# Altium footprint library MyComponents_v2.5.PcbLib: 403 footprints (part 21 of 26)
Each footprint in its own frame and in the unit in brackets; x right, y up, seen from the top. Pads: shape width x height; smd on the part's side, far side on the other; paste and mask are expansions set on the pad; w line width, h text height; cw(c..) or ccw(c..) is an arc to the next point about the centre after c.
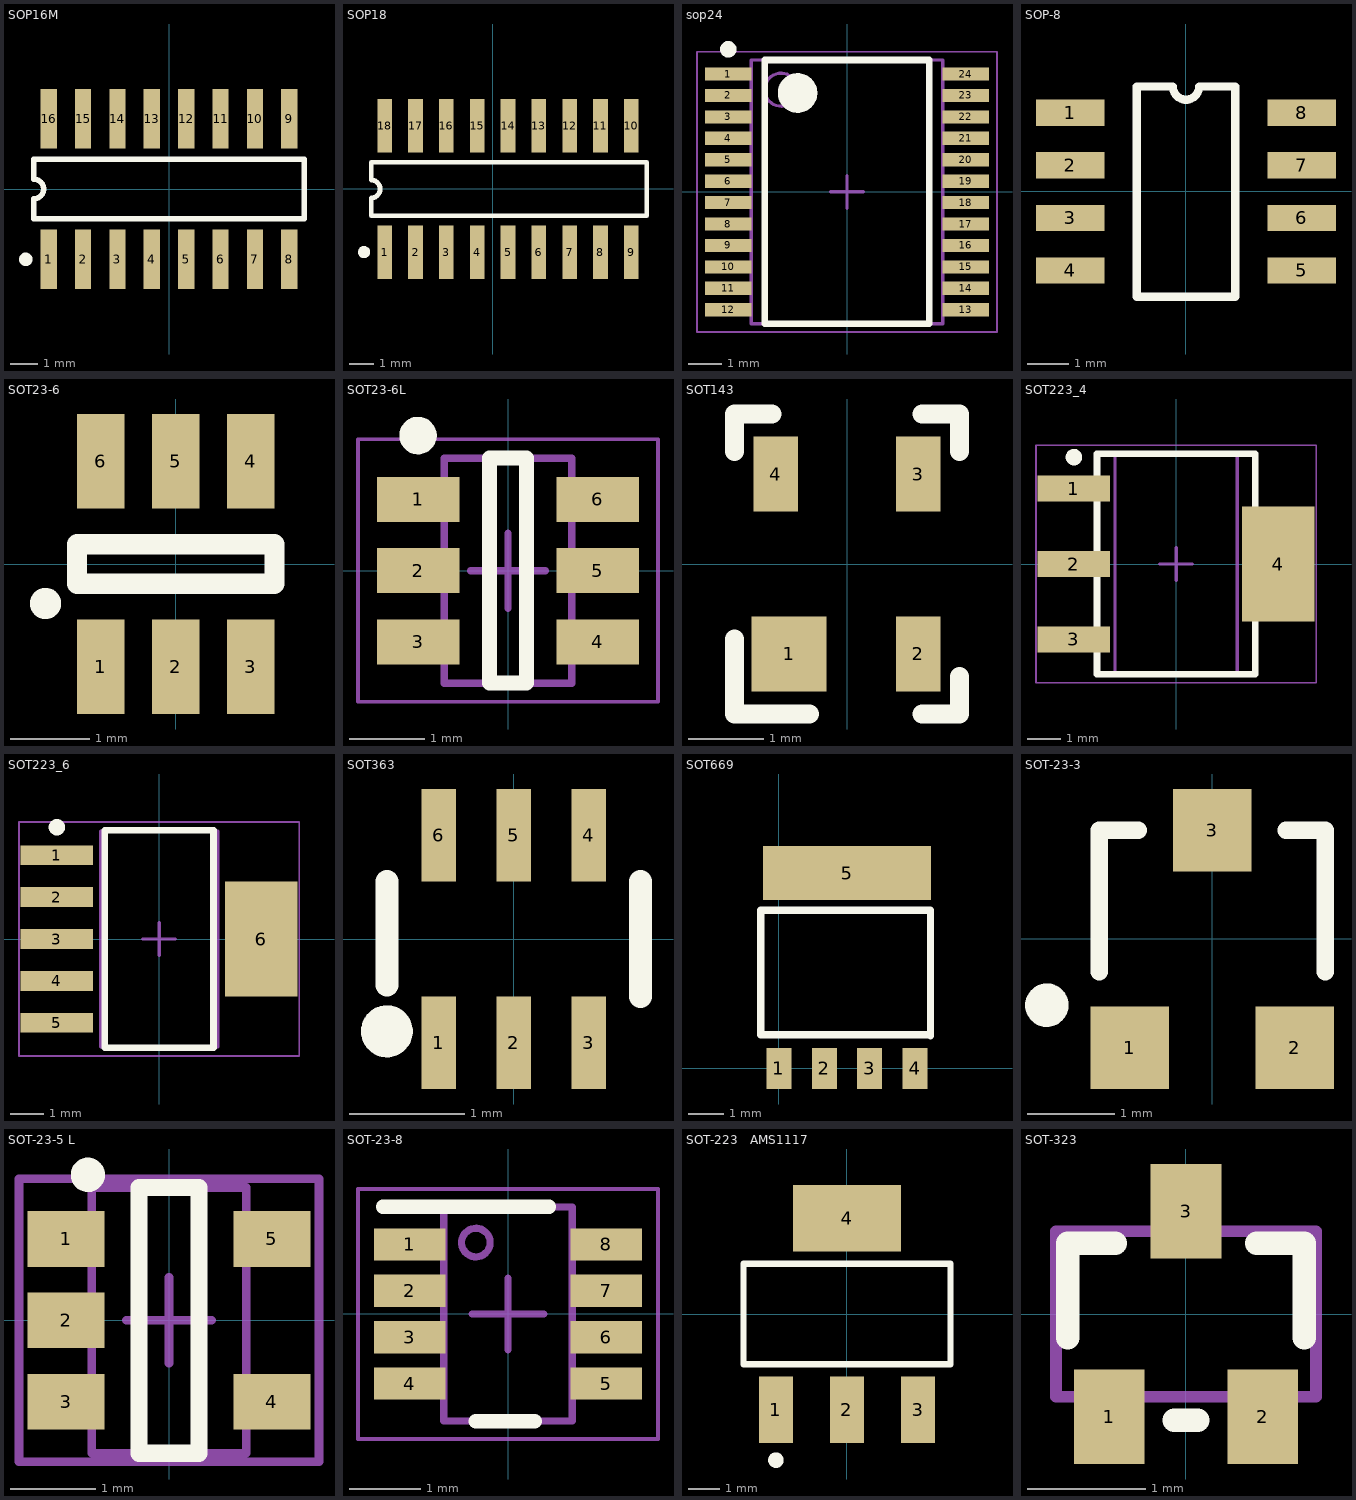
[diagram p20: the footprints below, top view; thin cyan lines are the x and y axes]

## SOP16M [mm]
pads (16):
  rect 0.6x2.2 smd: 1(-4.445,-2.6) 2(-3.175,-2.6) 3(-1.905,-2.6) 4(-0.635,-2.6) 5(0.635,-2.6) 6(1.905,-2.6) 7(3.175,-2.6) 8(4.445,-2.6) 9(4.445,2.6) 10(3.175,2.6) 11(1.905,2.6) 12(0.635,2.6) 13(-0.635,2.6) 14(-1.905,2.6) 15(-3.175,2.6) 16(-4.445,2.6)
Top Overlay:
  circle w0.25: c-5.295,-2.6 r0.125
  lines w0.2: -5,-1.1 -5,-0.367 ccw(c-5,0) -5,0.367 -5,1.1 5,1.1 5,-1.1 -5,-1.1

## SOP18 [mm]
pads (18):
  rect 0.6x2.2 smd: 1(-4.445,-2.6) 2(-3.175,-2.6) 3(-1.905,-2.6) 4(-0.635,-2.6) 5(0.635,-2.6) 6(1.905,-2.6) 7(3.175,-2.6) 8(4.445,-2.6) 9(5.715,-2.6) 10(5.715,2.6) 11(4.445,2.6) 12(3.175,2.6) 13(1.905,2.6) 14(0.635,2.6) 15(-0.635,2.6) 16(-1.905,2.6) 17(-3.175,2.6) 18(-4.445,2.6)
Top Overlay:
  circle w0.25: c-5.295,-2.6 r0.125
  lines w0.2: -5,-1.1 -5,-0.367 ccw(c-5,0) -5,0.367 -5,1.1 6.35,1.1 6.35,-1.1 -5,-1.1

## sop24 [mm] "TSOP, 24-Leads, Body 7.80x5.60mm, Pitch 0.65mm, IPC Medium Density"
height 1.6
pads (24):
  rect 1.4x0.4 smd: 1(-3.6,3.575) 2(-3.6,2.925) 3(-3.6,2.275) 4(-3.6,1.625) 5(-3.6,0.975) 6(-3.6,0.325) 7(-3.6,-0.325) 8(-3.6,-0.975) 9(-3.6,-1.625) 10(-3.6,-2.275) 11(-3.6,-2.925) 12(-3.6,-3.575) 13(3.6,-3.575) 14(3.6,-2.925) 15(3.6,-2.275) 16(3.6,-1.625) 17(3.6,-0.975) 18(3.6,-0.325) 19(3.6,0.325) 20(3.6,0.975) 21(3.6,1.625) 22(3.6,2.275) 23(3.6,2.925) 24(3.6,3.575)
Top Overlay:
  circle w0.6: c-1.5,3 r0.3
  circle w0.25: c-3.6,4.325 r0.125
  lines w0.2: -2.5,-4 2.5,-4 2.5,4 -2.5,4 -2.5,-4
Mechanical 13:
  circle w0.1: c-2,3.1 r0.5
  lines w0.1: -2.9,-4 2.9,-4 2.9,4 -2.9,4 -2.9,-4
Mechanical 15:
  lines w0.05: -4.55,-4.25 4.55,-4.25 4.55,4.25 -4.55,4.25 -4.55,-4.25
  lines w0.1: -0.5,0 0.5,0 ; 0,-0.5 0,0.5
3D body: height 1.6, standoff 0.1, extent -2.9,-4 2.9,4

## SOP-8 [mm]
pads (8):
  rect 1.651x0.635 smd: 1(-2.8,1.9) 2(-2.8,0.63) 3(-2.8,-0.64) 4(-2.8,-1.91) 5(2.8,-1.91) 6(2.8,-0.64) 7(2.8,0.63) 8(2.8,1.9)
Top Overlay:
  lines w0.2: -1.19,-2.545 1.19,-2.545 1.19,2.535 0.317,2.535 cw(c0,2.535) -0.318,2.535 -1.19,2.535 -1.19,-2.545
3D body "SOP8.STEP": height 1.6, standoff 0, extent -3.021,-2.51 3.021,2.51

## SOT23-6 [mm]
pads (6):
  rect 0.6x1.2 smd: 1(-0.95,-1.3) 2(0,-1.3) 3(0.95,-1.3) 4(0.95,1.3) 5(0,1.3) 6(-0.95,1.3)
Top Overlay:
  circle w0.254: c-1.65,-0.5 r0.071
  lines w0.254: -1.25,-0.25 1.25,-0.25 1.25,0.25 -1.25,0.25 -1.25,-0.25
3D body "SOT23-6-2.step": height 1.45, standoff 0, extent -1.478,-1.451 1.422,1.349

## SOT23-6L [mm] "SOT23, 6-Leads, Body 2.90x2.80mm, Pitch 0.95mm, IPC Medium Density"
height 1.45
pads (6):
  rect 1.1x0.6 smd: 1(-1.2,0.95) 2(-1.2,0) 3(-1.2,-0.95) 4(1.2,-0.95) 5(1.2,0) 6(1.2,0.95)
Top Overlay:
  circle w0.25: c-1.2,1.8 r0.125
  lines w0.2: -0.25,-1.5 -0.25,1.5 0.25,1.5 0.25,-1.5 -0.25,-1.5
Mechanical 13:
  lines w0.1: -0.85,-1.5 0.85,-1.5 0.85,1.5 -0.85,1.5 -0.85,-1.5
Mechanical 15:
  lines w0.05: -2,-1.75 2,-1.75 2,1.75 -2,1.75 -2,-1.75
  lines w0.1: -0.5,0 0.5,0 ; 0,-0.5 0,0.5
3D body: height 0.25, standoff 0, extent -0.483,-1.219 -0.483,-1.219
3D body "SOT23-6-2.step": height 1.45, standoff 0, extent -1.374,-1.475 1.426,1.425

## SOT143 [mm]
pads (4):
  rect 1x1 smd: 1(-0.77,-1.2)
  rect 0.6x1 smd: 2(0.95,-1.2) 3(0.95,1.2) 4(-0.95,1.2)
Top Overlay:
  lines w0.254: -1.5,-1 -1.5,-2 -0.5,-2 ; -1.5,1.5 -1.5,2 -1,2 ; 1,-2 1.5,-2 1.5,-1.5 ; 1,2 1.5,2 1.5,1.5
3D body "User Library-sot143.STEP": height 1, standoff 0, extent -1.46,-1.21 1.46,1.21

## SOT223_4 [mm] "SOT223, 4-Leads, Body 6.50x7.00mm (avg), Pitch 2.29mm, IPC Medium Density"
height 1.8
pads (4):
  rect 2.2x0.8 smd: 1(-3.1,2.29) 2(-3.1,0) 3(-3.1,-2.29)
  rect 2.2x3.5 smd: 4(3.1,0)
Top Overlay:
  circle w0.25: c-3.1,3.24 r0.125
  lines w0.2: -2.4,-3.35 -2.4,3.35 2.4,3.35 2.4,-3.35 -2.4,-3.35
Mechanical 13:
  lines w0.1: -1.855,-3.355 -1.855,3.355 1.855,3.355 1.855,-3.355 -1.855,-3.355
Mechanical 15:
  lines w0.05: -4.25,-3.6 -4.25,3.6 4.25,3.6 4.25,-3.6 -4.25,-3.6
  lines w0.1: -0.5,0 0.5,0 ; 0,-0.5 0,0.5
3D body: height 1.8, standoff 0.64, extent -1.855,-3.355 1.855,3.355

## SOT223_6 [mm] "SOT223, 6-Leads, Body 6.50x7.06mm (avg), Pitch 1.27mm, IPC Medium Density"
height 1.65
pads (6):
  rect 2.2x0.6 smd: 1(-3.1,2.54) 2(-3.1,1.27) 3(-3.1,0) 4(-3.1,-1.27) 5(-3.1,-2.54)
  rect 2.2x3.5 smd: 6(3.1,0)
Top Overlay:
  circle w0.25: c-3.1,3.39 r0.125
  lines w0.2: -1.65,-3.3 -1.65,3.3 1.65,3.3 1.65,-3.3 -1.65,-3.3
Mechanical 13:
  lines w0.1: -1.775,-3.275 -1.775,3.275 1.775,3.275 1.775,-3.275 -1.775,-3.275
Mechanical 15:
  lines w0.05: -4.25,-3.55 -4.25,3.55 4.25,3.55 4.25,-3.55 -4.25,-3.55
  lines w0.1: -0.5,0 0.5,0 ; 0,-0.5 0,0.5
3D body: height 1.65, standoff 0.02, extent -1.775,-3.275 1.775,3.275

## SOT363 [mm]
pads (6):
  rect 0.3x0.8 smd: 1(-0.65,-0.9) 2(0,-0.9) 3(0.65,-0.9) 4(0.65,0.9) 5(0,0.9) 6(-0.65,0.9)
Top Overlay:
  circle w0.25: c-1.1,-0.8 r0.1
  lines w0.2: -1.1,-0.4 -1.1,0.5 ; 1.1,-0.5 1.1,0.5
3D body "sot363.step": height 1, standoff 0, extent -1.05,-1.15 1.05,1.15

## SOT669 [mm]
pads (5):
  rect 0.7x1.15 smd: 1(0,0) 2(1.27,0) 3(2.54,0) 4(3.81,0)
  rect 4.7x1.5 smd: 5(1.905,5.461)
Top Overlay:
  lines w0.203: -0.508,0.94 -0.508,4.42 4.242,4.42 4.242,4.369 4.242,0.914 4.216,0.94 -0.508,0.94

## SOT-23-3 [mm]
pads (3):
  rect 0.9x0.95 smd: 1(-0.95,-1.25) 2(0.95,-1.25) 3(0,1.25)
Top Overlay:
  circle w0.25: c-1.903,-0.762 r0.125
  lines w0.2: -1.3,-0.375 -1.3,1.25 -0.85,1.25 ; 0.85,1.25 1.3,1.25 1.3,-0.375
3D body "sot23-3.STEP": height 1, standoff -0.02, extent -1.46,-1.194 1.46,1.282

## SOT-23-5 L [mm]
pads (5):
  rect 0.9x0.65 smd: 1(-1.2,0.95) 2(-1.2,0) 3(-1.2,-0.95) 4(1.2,-0.95) 5(1.2,0.95)
Top Overlay:
  circle w0.2: c-0.946,1.698 r0.1
  lines w0.2: -0.35,-1.55 -0.35,1.55 0.35,1.55 0.35,-1.55 -0.35,-1.55
Mechanical 13:
  lines w0.1: -0.9,-1.55 0.9,-1.55 0.9,1.55 -0.9,1.55 -0.9,-1.55
Mechanical 15:
  lines w0.1: -0.5,0 0.5,0 ; 0,-0.5 0,0.5 ; -1.75,-1.65 1.75,-1.65 1.75,1.65 -1.75,1.65 -1.75,-1.65
3D body "User Library-SOT23-5.STEP": height 1.09, standoff -0.01, extent -1.375,-1.46 1.425,1.44

## SOT-23-8 [mm]
pads (8):
  rect 1x0.45 smd paste+0 mask+0.051: 1(-1.375,0.975) 2(-1.375,0.325) 3(-1.375,-0.325) 4(-1.375,-0.975) 5(1.375,-0.975) 6(1.375,-0.325) 7(1.375,0.325) 8(1.375,0.975)
Top Overlay:
  lines w0.2: -1.75,1.5 0.575,1.5 ; -0.45,-1.5 0.375,-1.5
Mechanical 13:
  circle w0.1: c-0.45,1 r0.2
  lines w0.1: -0.9,-1.5 0.9,-1.5 0.9,1.5 -0.9,1.5 -0.9,-1.5
Mechanical 15:
  lines w0.05: -2.1,-1.75 -2.1,1.75 2.1,1.75 2.1,-1.75 -2.1,-1.75
  lines w0.1: -0.5,0 0.5,0 ; 0,-0.5 0,0.5
3D body "sot238.step": height 1.2, standoff 0, extent -1.4,-1.47 1.4,1.47

## SOT-223   AMS1117 [mm] "SOT-223/SC-73; 4 Leads; Body 6.7 x 7.3 mm, inc. leads (LxW max)"
height 1.78
pads (4):
  rect 1.1x2.15 smd: 1(-2.3,-3.1) 2(0,-3.1) 3(2.3,-3.1)
  rect 3.5x2.15 smd: 4(0,3.1)
Top Overlay:
  circle w0.25: c-2.3,-4.725 r0.125
  lines w0.2: -3.35,-1.625 3.35,-1.625 3.35,1.625 -3.35,1.625 -3.35,-1.625
3D body: height 1.7, standoff 0, extent -3.225,-3.5 3.275,3.5

## SOT-323 [mm]
pads (3):
  rect 0.6x0.8 smd: 1(-0.65,-0.87) 2(0.65,-0.87) 3(0,0.87)
Top Overlay:
  lines w0.2: -1,-0.2 -1,0.6 -0.6,0.6 ; -0.1,-0.9 0.1,-0.9 ; 0.6,0.6 1,0.6 1,-0.2
Mechanical 13:
  lines w0.1: -1.1,-0.7 1.1,-0.7 1.1,0.7 -1.1,0.7 -1.1,-0.7
3D body "SOT323-sc70-3.step": height 1, standoff 0, extent -1.05,-1.15 1.05,1.15